# Altium footprint library M_Derogarian Altium Library.PcbLib: 137 footprints (part 8 of 9)
Each footprint in its own frame and in the unit in brackets; x right, y up, seen from the top. Pads: shape width x height; smd on the part's side, far side on the other; paste and mask are expansions set on the pad; w line width, h text height; cw(c..) or ccw(c..) is an arc to the next point about the centre after c.
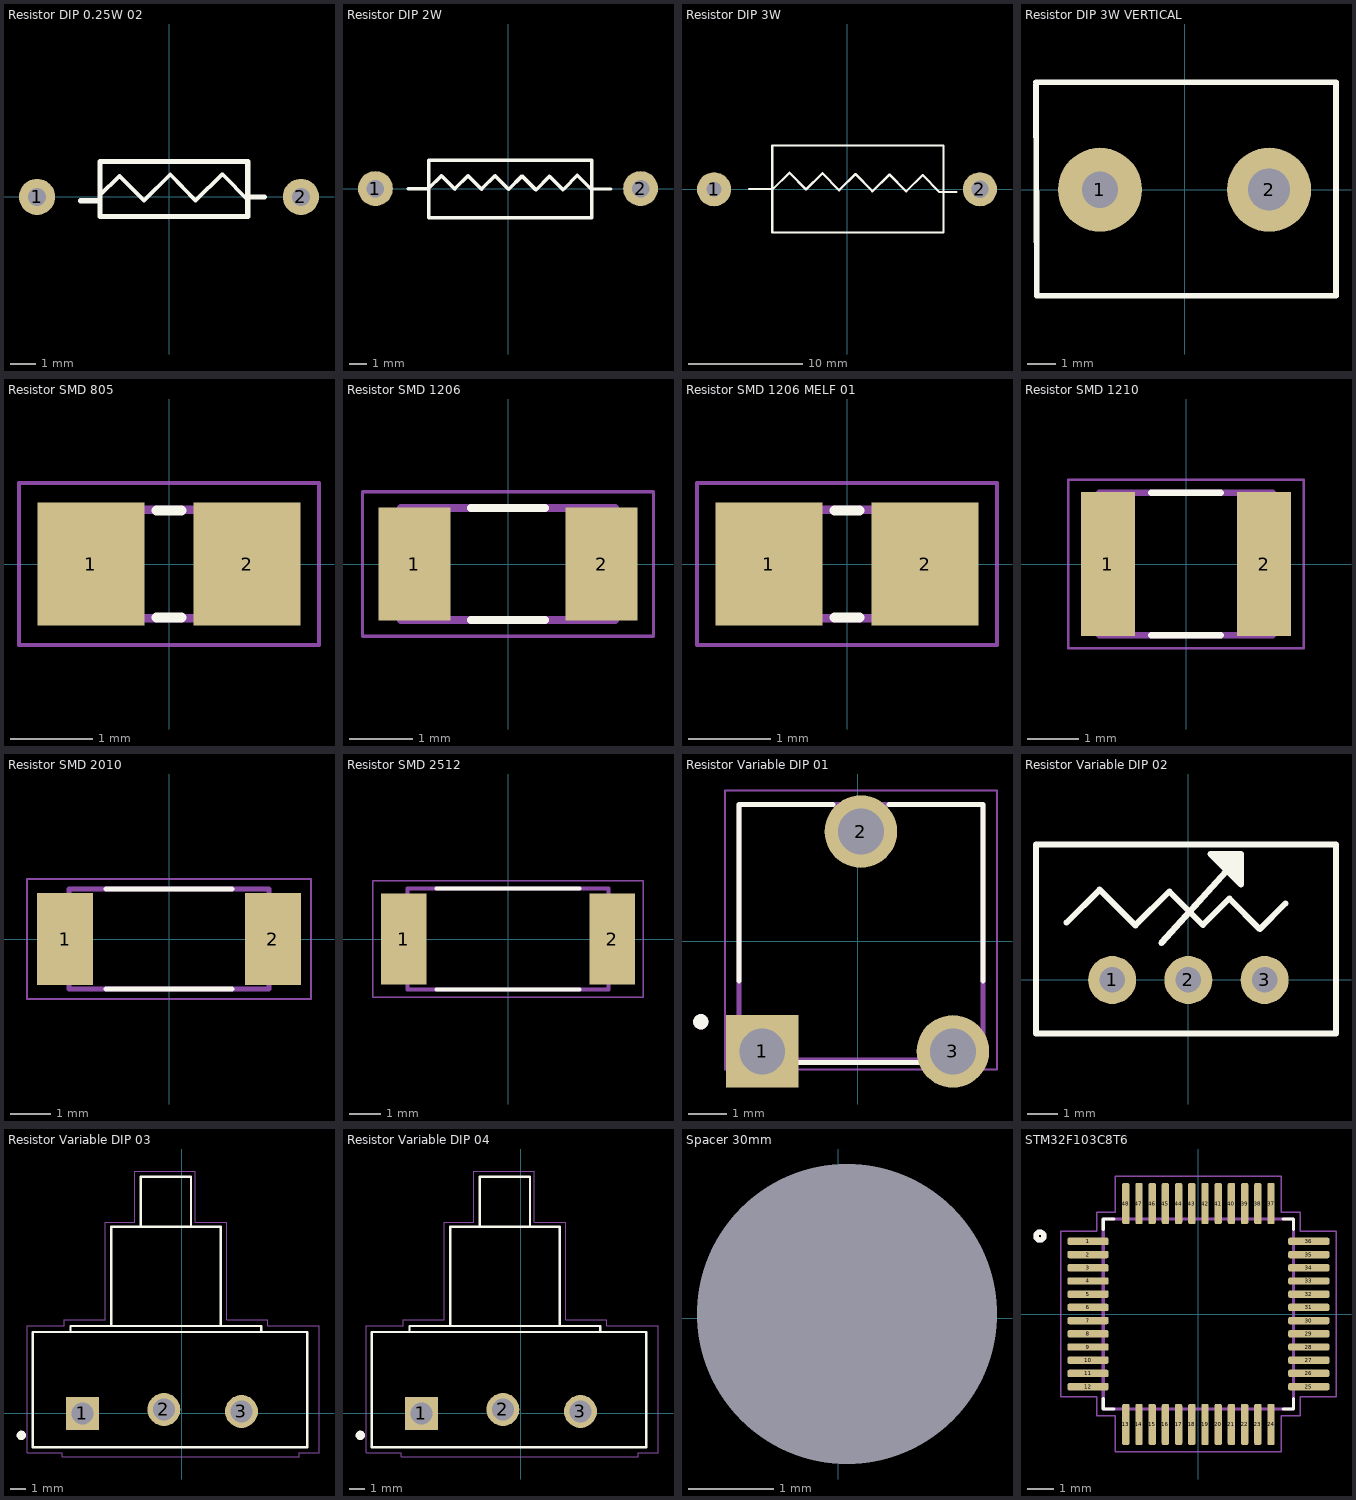
[diagram p7: the footprints below, top view; thin cyan lines are the x and y axes]

## Resistor DIP 0.25W 02 [mm]
height 2.54
pads (2):
  round 1.4 hole 0.7: 1(-5.105,0) 2(5.105,0)
Top Overlay:
  lines w0.15: -2.687,0.046 -1.914,0.801 -0.968,-0.145 0.048,0.871 1.03,-0.136 2.069,0.877 3.073,-0.152
  lines w0.2: -3.421,-0.152 -2.684,-0.152 ; 3.048,0 3.687,0 ; -2.667,-0.762 -2.667,1.372 3.048,1.372 3.048,-0.762 -2.667,-0.762
3D body "User Library-Res40-Axial 0_25W-3_3K.STEP": height 2.71, standoff -1.7, extent -5.329,-1.232 5.431,1.168

## Resistor DIP 2W [mm]
height 5.08
pads (2):
  round 2 hole 1: 1(-7.607,0) 2(7.607,0)
Top Overlay:
  lines w0.2: -5.728,0 -4.559,0 ; -4.578,-0.019 -3.816,0.743 -3.042,-0.032 ; -3.054,-0.019 -2.292,0.743 -1.518,-0.032 ; -1.505,-0.019 -0.743,0.743 0.032,-0.032 ; 0.044,-0.044 0.806,0.718 1.581,-0.057 ; 1.619,-0.059 2.381,0.703 3.155,-0.072 ; 3.219,-0.008 3.981,0.754 4.755,-0.021 ; 4.788,-0.025 5.905,-0.025 ; -4.559,-1.651 -4.559,1.626 4.801,1.626 4.801,-1.676 -4.534,-1.676 -4.559,-1.651
3D body "User Library-PR02.STEP": height 4.25, standoff -8.13, extent -7.982,-1.97 8.058,1.93

## Resistor DIP 3W [mm]
height 7.62
pads (2):
  round 3 hole 1.3: 1(-11.671,0)
  round 3 hole 1.5: 2(11.671,0)
Top Overlay:
  lines w0.2: -8.598,0.025 -6.693,0.025 ; -6.565,-0.039 -5.049,1.45 -3.596,-0.028 -2.144,1.4 -0.692,-0.078 ; -0.701,-0.079 0.752,1.349 2.203,-0.129 ; 2.224,-0.191 3.739,1.298 5.192,-0.18 6.644,1.247 8.095,-0.229 9.588,-0.229 ; -6.566,-3.785 -6.566,3.835 8.471,3.835 8.471,-3.785 -6.566,-3.785
3D body "User Library-PR03.STEP": height 7.2, standoff -5.9, extent -11.893,-2.635 11.766,2.565

## Resistor DIP 3W VERTICAL [mm]
height 7.62
pads (2):
  round 3 hole 1.3: 1(-3.023,0)
  round 3 hole 1.5: 2(3.023,0)
Top Overlay:
  lines w0.2: -5.309,3.734 -5.283,-3.785 5.41,-3.785 5.41,3.835 -5.309,3.835
3D body "User Library-AXIAL_RESISTOR(3W_VERT).STEP": height 23.55, standoff -2.6, extent -3.565,-3.196 4.835,3.404

## Resistor SMD 805 [mm]
pads (2):
  rect 1.3x1.5 smd: 1(-0.95,0) 2(0.95,0)
Top Overlay:
  lines w0.127: -0.15,-0.65 0.15,-0.65 ; -0.15,0.65 0.15,0.65
Mechanical 13:
  region: -0.342,-0.725 -1.094,-0.725 -1.094,0.726 -0.342,0.726
  region: 1.106,-0.725 0.356,-0.725 0.356,0.726 1.106,0.726
  lines w0.102: -0.381,0.66 0.381,0.66 ; -0.356,-0.66 0.381,-0.66
Mechanical 15:
  lines w0.051: -1.823,-0.983 1.823,-0.983 1.823,0.983 -1.823,0.983 -1.823,-0.983
3D body "step_temp.STEP": height 0.6, standoff 0, extent -1,-0.625 1,0.625

## Resistor SMD 1206 [mm]
pads (2):
  rect 1.13x1.77 smd: 1(-1.47,0) 2(1.47,0)
Top Overlay:
  lines w0.127: -0.58,-0.88 0.58,-0.88 ; -0.58,0.88 0.58,0.88
Mechanical 13:
  lines w0.127: -1.68,-0.88 1.68,-0.88 1.68,0.88 -1.68,0.88 -1.68,-0.88
Mechanical 15:
  lines w0.05: -2.285,-1.135 2.285,-1.135 2.285,1.135 -2.285,1.135 -2.285,-1.135
3D body "User Library-RESC3216X06N.STEP": height 0.55, standoff 0, extent -1.625,-0.774 1.575,0.826

## Resistor SMD 1206 MELF 01 [mm]
pads (2):
  rect 1.3x1.5 smd: 1(-0.95,0) 2(0.95,0)
Top Overlay:
  lines w0.127: -0.15,-0.65 0.15,-0.65 ; -0.15,0.65 0.15,0.65
Mechanical 13:
  region: 1.106,-0.724 0.356,-0.724 0.356,0.726 1.106,0.726
  region: -0.342,-0.724 -1.092,-0.724 -1.092,0.726 -0.342,0.726
  lines w0.102: -0.381,0.66 0.381,0.66 ; -0.356,-0.66 0.381,-0.66
Mechanical 15:
  lines w0.051: -1.823,-0.983 -1.823,0.983 1.823,0.983 1.823,-0.983 -1.823,-0.983
3D body "MMU01020C5601FB000.STEP": height 1.1, standoff 0, extent -1.126,-0.579 1.074,0.521

## Resistor SMD 1210 [mm]
pads (2):
  rect 1.06x2.82 smd: 1(-1.528,0) 2(1.528,0)
Top Overlay:
  lines w0.127: -0.68,-1.4 0.68,-1.4 ; -0.68,1.4 0.68,1.4
Mechanical 13:
  lines w0.127: -1.7,-1.4 -1.7,1.4 1.7,1.4 1.7,-1.4 -1.7,-1.4
Mechanical 15:
  lines w0.05: -2.308,-1.65 -2.308,1.65 2.308,1.65 2.308,-1.65 -2.308,-1.65
3D body "User Library-RESC3225X06N.STEP": height 0.55, standoff 0, extent -1.625,-1.199 1.575,1.301

## Resistor SMD 2010 [mm]
pads (2):
  rect 1.4x2.3 smd: 1(-2.6,0) 2(2.6,0)
Top Overlay:
  lines w0.127: -1.58,-1.25 1.58,-1.25 ; -1.58,1.25 1.58,1.25
Mechanical 13:
  lines w0.127: -2.5,-1.25 2.5,-1.25 2.5,1.25 -2.5,1.25 -2.5,-1.25
Mechanical 15:
  lines w0.05: -3.55,-1.5 3.55,-1.5 3.55,1.5 -3.55,1.5 -3.55,-1.5
3D body "User Library-R2010-2.STEP": height 0.6, standoff 0, extent -2.449,-1.245 2.551,1.255

## Resistor SMD 2512 [mm]
pads (2):
  rect 1.45x2.9 smd: 1(-3.325,0) 2(3.325,0)
Top Overlay:
  lines w0.127: -2.28,-1.6 2.28,-1.6 ; -2.28,1.6 2.28,1.6
Mechanical 13:
  lines w0.127: -3.2,-1.6 3.2,-1.6 3.2,1.6 -3.2,1.6 -3.2,-1.6
Mechanical 15:
  lines w0.05: -4.3,-1.85 4.3,-1.85 4.3,1.85 -4.3,1.85 -4.3,-1.85
3D body "User Library-RESC6432X06.STEP": height 0.6, standoff 0, extent -3.225,-1.6 3.175,1.6

## Resistor Variable DIP 01 [mm]
pads (3):
  rect 1.9x1.9 hole 1.2: 1(-2.502,-2.883)
  round 1.9 hole 1.2: 2(0.089,2.883) 3(2.502,-2.883)
Top Overlay:
  circle w0.2: c-4.111,-2.106 r0.1
  lines w0.127: -3.111,-3.176 3.289,-3.176 ; -3.111,-1.036 -3.111,3.594 -0.641,3.594 ; 0.819,3.594 3.289,3.594 3.289,-1.036
Mechanical 13:
  circle w0.2: c-4.111,-2.106 r0.1
  lines w0.127: -3.111,-3.106 3.289,-3.106 3.289,3.594 -3.111,3.594 -3.111,-3.106
Mechanical 15:
  lines w0.05: -3.481,-3.356 3.659,-3.356 3.659,3.964 -3.481,3.964 -3.481,-3.356
3D body "User Library-Trimmer, 3306F-1.STEP": height 7.62, standoff -3.04, extent -3.468,-4.89 3.342,3.362

## Resistor Variable DIP 02 [mm]
height 1.524
pads (3):
  round 1.6 hole 0.85: 1(-2.54,0) 2(0,0) 3(2.54,0)
Top Overlay:
  lines w0.2: -4.064,1.908 -2.959,3.013 -1.765,1.819 -0.635,2.95 0.483,1.832 1.365,2.715 2.383,1.697 3.238,2.553 ; -0.898,1.241 1.27,3.628 1.27,4.194 ; 1.016,4.115 1.648,3.482 1.484,4.023 1.484,3.621 1.397,3.534 1.397,4.194 ; 1.335,3.608 1.601,3.874 ; 1.471,3.922 1.738,4.189 ; 1.492,3.854 1.753,4.115 1.753,3.178 0.737,4.194 1.753,4.194 1.753,3.902 1.486,3.635 1.486,3.585 1.753,3.318 ; 1.695,3.756 1.695,3.439 1.708,3.451 1.708,3.362 1.753,3.407 1.753,3.813 ; -5.08,-1.789 -5.08,4.521 4.92,4.521 4.92,-1.789 -5.08,-1.789
3D body "User Library-3299W-1-103RLF.STEP": height 12.56, standoff -5.22, extent -4.763,-1.905 4.762,4.191

## Resistor Variable DIP 03 [mm]
pads (3):
  rect 2.1x2.1 hole 1.4: 1(-6.35,0)
  round 2.1 hole 1.4: 2(-1.143,0.254) 3(3.81,0.127)
Top Overlay:
  circle w0.3: c-10.25,-1.397 r0.15
  lines w0.152: -7.111,5.203 -7.111,5.583 -4.516,5.583 ; 5.079,5.203 5.079,5.583 2.484,5.583 ; -4.516,5.583 2.484,5.583 ; -4.516,5.583 -4.516,11.933 -2.616,11.933 ; -2.616,11.933 0.584,11.933 ; -2.616,11.933 -2.616,15.113 0.584,15.113 0.584,11.933 ; 0.584,11.933 2.484,11.933 2.484,5.583 ; -9.525,-2.147 -9.525,5.203 -6.095,5.203 6.095,5.203 8.001,5.203 8.001,-2.147 -9.525,-2.147
Mechanical 15:
  lines w0.05: -9.875,5.6 -8.36,5.603 -7.516,5.603 -7.516,5.978 -4.891,5.978 -4.891,12.228 -3.016,12.228 -3.016,15.478 0.859,15.478 0.859,12.228 2.859,12.228 2.859,5.978 5.484,5.978 5.484,5.603 8.763,5.603 8.763,-2.475 ; -9.875,5.603 -9.875,-2.522 -7.625,-2.522 -7.625,-2.772 7.5,-2.772 7.5,-2.522 8.763,-2.522 ; -9,5.603 -8,5.603
3D body "User Library-TrimPot.STEP": height 21.3, standoff -3.9, extent -9.635,-5.521 7.349,18.679

## Resistor Variable DIP 04 [mm]
pads (3):
  rect 2.1x2.1 hole 1.4: 1(-6.35,0)
  round 2.1 hole 1.4: 2(-1.143,0.254) 3(3.81,0.127)
Top Overlay:
  circle w0.3: c-10.25,-1.397 r0.15
  lines w0.152: -7.111,5.203 -7.111,5.583 -4.516,5.583 ; 5.079,5.203 5.079,5.583 2.484,5.583 ; -4.516,5.583 2.484,5.583 ; -4.516,5.583 -4.516,11.933 -2.616,11.933 ; -2.616,11.933 0.584,11.933 ; -2.616,11.933 -2.616,15.113 0.584,15.113 0.584,11.933 ; 0.584,11.933 2.484,11.933 2.484,5.583 ; -9.525,-2.147 -9.525,5.203 -6.095,5.203 6.095,5.203 8.001,5.203 8.001,-2.147 -9.525,-2.147
Mechanical 15:
  lines w0.05: -9.875,5.6 -8.36,5.603 -7.516,5.603 -7.516,5.978 -4.891,5.978 -4.891,12.228 -3.016,12.228 -3.016,15.478 0.859,15.478 0.859,12.228 2.859,12.228 2.859,5.978 5.484,5.978 5.484,5.603 8.763,5.603 8.763,-2.475 ; -9.875,5.603 -9.875,-2.522 -7.625,-2.522 -7.625,-2.772 7.5,-2.772 7.5,-2.522 8.763,-2.522 ; -9,5.603 -8,5.603
3D body "User Library-User Library-Potentiometer.STEP": height 21.38, standoff -3.56, extent -9.557,-5.475 7.207,18.655

## Spacer 30mm [mil]
pads (1):
  round 0 hole 137.8: ""(4,2)
3D body "DSMM3050030_BUFAB.step": height 393.7, standoff -1181.1, extent -98.85,-125 98,102.3

## STM32F103C8T6 [mm] "ARM® Cortex®-M3 STM32F1 Microcontroller IC 32-Bit 72MHz 64KB"
pads (48):
  rrect50% 1.56x0.28 smd: 1(-4.18,2.75) 2(-4.18,2.25) 3(-4.18,1.75) 4(-4.18,1.25) 5(-4.18,0.75) 6(-4.18,0.25) 7(-4.18,-0.25) 8(-4.18,-0.75) 9(-4.18,-1.25) 10(-4.18,-1.75) 11(-4.18,-2.25) 12(-4.18,-2.75) 25(4.18,-2.75) 26(4.18,-2.25) 27(4.18,-1.75) 28(4.18,-1.25) 29(4.18,-0.75) 30(4.18,-0.25) 31(4.18,0.25) 32(4.18,0.75) 33(4.18,1.25) 34(4.18,1.75) 35(4.18,2.25) 36(4.18,2.75)
  rrect50% 0.28x1.56 smd: 13(-2.75,-4.18) 14(-2.25,-4.18) 15(-1.75,-4.18) 16(-1.25,-4.18) 17(-0.75,-4.18) 18(-0.25,-4.18) 19(0.25,-4.18) 20(0.75,-4.18) 21(1.25,-4.18) 22(1.75,-4.18) 23(2.25,-4.18) 24(2.75,-4.18) 37(2.75,4.18) 38(2.25,4.18) 39(1.75,4.18) 40(1.25,4.18) 41(0.75,4.18) 42(0.25,4.18) 43(-0.25,4.18) 44(-0.75,4.18) 45(-1.25,4.18) 46(-1.75,4.18) 47(-2.25,4.18) 48(-2.75,4.18)
Top Overlay:
  circle w0.2: c-6,2.95 r0.15
  lines w0.127: -3.6,-3.21 -3.6,-3.6 -3.21,-3.6 ; -3.6,3.21 -3.6,3.6 -3.21,3.6 ; 3.21,-3.6 3.6,-3.6 3.6,-3.21 ; 3.21,3.6 3.6,3.6 3.6,3.21
Mechanical 13:
  circle w0.2: c-6,2.95 r0.15
  lines w0.127: -3.6,-3.6 -3.6,3.6 3.6,3.6 3.6,-3.6 -3.6,-3.6
Mechanical 15:
  lines w0.05: -5.21,-3.14 -5.21,3.14 -3.85,3.14 -3.85,3.85 -3.14,3.85 -3.14,5.21 3.14,5.21 3.14,3.85 3.85,3.85 3.85,3.14 5.21,3.14 5.21,-3.14 3.85,-3.14 3.85,-3.85 3.14,-3.85 3.14,-5.21 -3.14,-5.21 -3.14,-3.85 -3.85,-3.85 -3.85,-3.14 -5.21,-3.14
3D body "User Library-LQFP50P900X900X160.STEP": height 1.6, standoff 0, extent -4.5,-4.5 4.5,4.5